# Altium footprint library ADP_SMT.PcbLib: 210 footprints (part 14 of 15)
Each footprint in its own frame and in the unit in brackets; x right, y up, seen from the top. Pads: shape width x height; smd on the part's side, far side on the other; paste and mask are expansions set on the pad; w line width, h text height; cw(c..) or ccw(c..) is an arc to the next point about the centre after c.
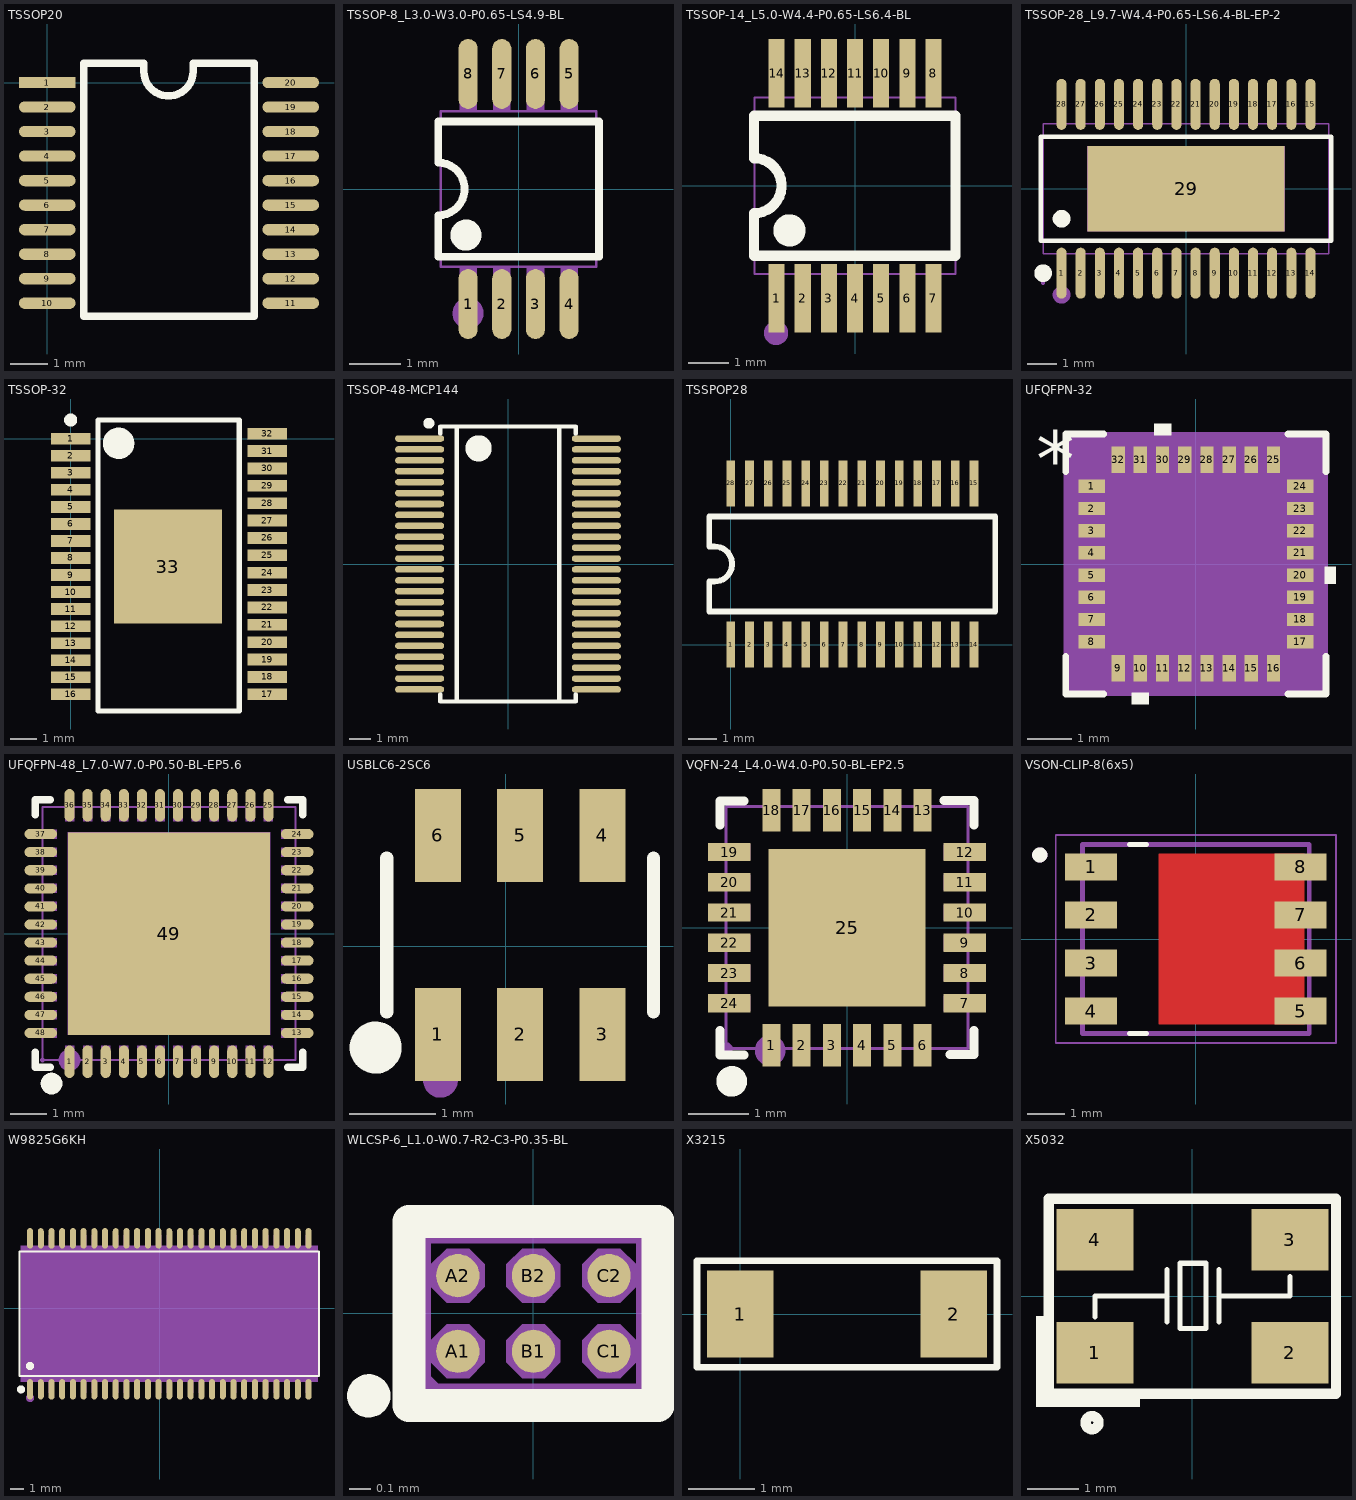
[diagram p13: the footprints below, top view; thin cyan lines are the x and y axes]

## TSSOP20 [mm]
pads (20):
  rect 1.5x0.3 smd: 1(0,0)
  oval 1.5x0.3 smd: 2(0,-0.65) 3(0,-1.3) 4(0,-1.95) 5(0,-2.6) 6(0,-3.25) 7(0,-3.9) 8(0,-4.55) 9(0,-5.2) 10(0,-5.85) 11(6.454,-5.85) 12(6.454,-5.2) 13(6.454,-4.55) 14(6.454,-3.9) 15(6.454,-3.25) 16(6.454,-2.6) 17(6.454,-1.95) 18(6.454,-1.3) 19(6.454,-0.65) 20(6.454,0)
Top Overlay:
  lines w0.2: 0.965,-6.2 0.965,0.508 2.559,0.508 2.559,0.3 ccw(c3.214,0.3) 3.87,0.3 3.87,0.508 5.486,0.508 5.486,-6.2 0.965,-6.2
3D body "TSSOP-20.STEP": height 1.2, standoff 0, extent -0.049,-6.221 6.501,0.379

## TSSOP-8_L3.0-W3.0-P0.65-LS4.9-BL [mm]
pads (8):
  oval 0.37x1.35 smd: 1(-0.975,-2.22) 2(-0.325,-2.22) 3(0.325,-2.22) 4(0.975,-2.22) 5(0.975,2.22) 6(0.325,2.22) 7(-0.325,2.22) 8(-0.975,2.22)
Top Overlay:
  circle w0.3: c-1.016,-0.889 r0.15
  lines w0.152: 1.552,1.298 1.552,-1.308 -1.552,-1.308 -1.552,-0.508 ccw(c-1.552,0) -1.552,0.508 -1.552,1.302 1.552,1.302
Mechanical 6:
  circle w0.3: c-0.975,-2.4 r0.15
Mechanical 15:
  region: 0.81,-2.45 0.81,-1.9 1.14,-1.9 1.14,-2.45
  region: 0.81,-1.91 0.81,-1.49 1.14,-1.49 1.14,-1.91
  region: 0.81,1.9 0.81,2.45 1.14,2.45 1.14,1.9
  region: 0.81,1.49 0.81,1.91 1.14,1.91 1.14,1.49
  region: -1.14,-2.45 -1.14,-1.9 -0.81,-1.9 -0.81,-2.45
  region: -1.14,-1.91 -1.14,-1.49 -0.81,-1.49 -0.81,-1.91
  region: -0.49,-2.45 -0.49,-1.9 -0.16,-1.9 -0.16,-2.45
  region: -0.49,-1.91 -0.49,-1.49 -0.16,-1.49 -0.16,-1.91
  region: 0.16,-2.45 0.16,-1.9 0.49,-1.9 0.49,-2.45
  region: 0.16,-1.91 0.16,-1.49 0.49,-1.49 0.49,-1.91
  region: -1.14,1.9 -1.14,2.45 -0.81,2.45 -0.81,1.9
  region: -1.14,1.49 -1.14,1.91 -0.81,1.91 -0.81,1.49
  region: -0.49,1.9 -0.49,2.45 -0.16,2.45 -0.16,1.9
  region: -0.49,1.49 -0.49,1.91 -0.16,1.91 -0.16,1.49
  region: 0.16,1.9 0.16,2.45 0.49,2.45 0.49,1.9
  region: 0.16,1.49 0.16,1.91 0.49,1.91 0.49,1.49
  region: -0.956,-0.889 -0.957,-0.865 -0.992,-0.83 -1.041,-0.83 -1.075,-0.865 -1.076,-0.889 -1.075,-0.914 -1.04,-0.948 -0.991,-0.948 -0.957,-0.913 -0.956,-0.889
  lines w0.051: -1.5,-1.5 1.5,-1.5 1.5,1.5 -1.5,1.5 -1.5,-1.5

## TSSOP-14_L5.0-W4.4-P0.65-LS6.4-BL [mm]
pads (14):
  rect 0.4x1.7 smd: 1(-1.95,-2.8) 2(-1.3,-2.8) 3(-0.65,-2.8) 4(0,-2.8) 5(0.65,-2.8) 6(1.3,-2.8) 7(1.95,-2.8) 8(1.95,2.8) 9(1.3,2.8) 10(0.65,2.8) 11(0,2.8) 12(-0.65,2.8) 13(-1.3,2.8) 14(-1.95,2.8)
Top Overlay:
  circle w0.4: c-1.63,-1.11 r0.2
  lines w0.254: -2.515,-1.74 2.5,-1.74 2.5,1.743 -2.515,1.743 -2.515,0.686 cw(c-2.515,0) -2.515,-0.686 -2.515,-1.74
Mechanical 6:
  circle w0.3: c-1.964,-3.662 r0.15
Mechanical 15:
  drawing of 33 lines, arcs and shapes, not listed

## TSSOP-28_L9.7-W4.4-P0.65-LS6.4-BL-EP-2 [mm]
pads (29):
  oval 0.343x1.731 smd: 1(-4.225,-2.866) 2(-3.575,-2.866) 3(-2.925,-2.866) 4(-2.275,-2.866) 5(-1.625,-2.866) 6(-0.975,-2.866) 7(-0.325,-2.866) 8(0.325,-2.866) 9(0.975,-2.866) 10(1.625,-2.866) 11(2.275,-2.866) 12(2.925,-2.866) 13(3.575,-2.866) 14(4.225,-2.866) 15(4.225,2.866) 16(3.575,2.866) 17(2.925,2.866) 18(2.275,2.866) 19(1.625,2.866) 20(0.975,2.866) 21(0.325,2.866) 22(-0.325,2.866) 23(-0.975,2.866) 24(-1.625,2.866) 25(-2.275,2.866) 26(-2.925,2.866) 27(-3.575,2.866) 28(-4.225,2.866)
  rect 6.7x2.9 smd paste+0 mask+0.05: 29(0,0)
Top Overlay:
  circle w0.3: c-4.225,-1.019 r0.15
  circle w0.3: c-4.849,-2.866 r0.15
  lines w0.152: -4.926,-1.771 4.926,-1.771 4.926,1.772 -4.926,1.772 -4.926,-1.771
Mechanical 6:
  circle w0.3: c-4.225,-3.6 r0.15
Mechanical 15:
  drawing of 62 lines, arcs and shapes, not listed

## TSSOP-32 [mm]
pads (33):
  rect 1.5x0.45 smd: 1(0,0) 2(0,-0.65) 3(0,-1.3) 4(0,-1.95) 5(0,-2.6) 6(0,-3.25) 7(0,-3.9) 8(0,-4.55) 9(0,-5.2) 10(0,-5.85) 11(0,-6.5) 12(0,-7.15) 13(0,-7.8) 14(0,-8.45) 15(0,-9.1) 16(0,-9.75) 17(7.5,-9.75) 18(7.5,-9.087) 19(7.5,-8.424) 20(7.5,-7.762) 21(7.5,-7.099) 22(7.5,-6.436) 23(7.5,-5.773) 24(7.5,-5.111) 25(7.5,-4.448) 26(7.5,-3.785) 27(7.5,-3.122) 28(7.5,-2.459) 29(7.5,-1.797) 30(7.5,-1.134) 31(7.5,-0.471) 32(7.5,0.192)
  rect 4.11x4.36 smd: 33(3.708,-4.877)
Top Overlay:
  circle w0.6: c1.829,-0.178 r0.3
  circle w0.25: c0,0.711 r0.125
  lines w0.2: 1.041,-10.389 1.041,0.711 6.426,0.711 6.426,-10.389 1.041,-10.389
3D body "User Library-TSSOP-32 11_1x6_2.STEP": height 1.1, standoff 0, extent -0.302,-10.351 7.798,0.749

## TSSOP-48-MCP144 [mm] "TSSOP, 48-Leads, Body 12.5x6.1mm, Pitch 0.5mm, IPC Medium Density"
height 1.2
pads (48):
  oval 2.25x0.3 smd: 1(-4.05,5.75) 2(-4.05,5.25) 3(-4.05,4.75) 4(-4.05,4.25) 5(-4.05,3.75) 6(-4.05,3.25) 7(-4.05,2.75) 8(-4.05,2.25) 9(-4.05,1.75) 10(-4.05,1.25) 11(-4.05,0.75) 12(-4.05,0.25) 13(-4.05,-0.25) 14(-4.05,-0.75) 15(-4.05,-1.25) 16(-4.05,-1.75) 17(-4.05,-2.25) 18(-4.05,-2.75) 19(-4.05,-3.25) 20(-4.05,-3.75) 21(-4.05,-4.25) 22(-4.05,-4.75) 23(-4.05,-5.25) 24(-4.05,-5.75) 25(4.05,-5.75) 26(4.05,-5.25) 27(4.05,-4.75) 28(4.05,-4.25) 29(4.05,-3.75) 30(4.05,-3.25) 31(4.05,-2.75) 32(4.05,-2.25) 33(4.05,-1.75) 34(4.05,-1.25) 35(4.05,-0.75) 36(4.05,-0.25) 37(4.05,0.25) 38(4.05,0.75) 39(4.05,1.25) 40(4.05,1.75) 41(4.05,2.25) 42(4.05,2.75) 43(4.05,3.25) 44(4.05,3.75) 45(4.05,4.25) 46(4.05,4.75) 47(4.05,5.25) 48(4.05,5.75)
Top Overlay:
  circle w0.25: c-3.625,6.45 r0.125
  circle w0.6: c-1.35,5.3 r0.3
  lines w0.2: -3.1,-5.969 -3.1,-6.3 3.1,-6.3 3.1,-5.969 ; -3.1,5.969 -3.1,6.3 3.1,6.3 3.1,5.969 ; -2.35,-6.3 -2.35,6.3 ; 2.35,-6.3 2.35,6.3
3D body "TSSOP-48-MCP144.STEP": height 1.2, standoff 0, extent -4.089,-6.299 4.099,6.301

## TSSPOP28 [mm]
pads (28):
  rect 0.3x1.6 smd: 1(0,0) 2(0.65,0) 3(1.299,0) 4(1.949,0) 5(2.599,0) 6(3.248,0) 7(3.898,0) 8(4.548,0) 9(5.197,0) 10(5.847,0) 11(6.497,0) 12(7.146,0) 13(7.796,0) 14(8.445,0) 15(8.445,5.6) 16(7.796,5.6) 17(7.146,5.6) 18(6.496,5.6) 19(5.847,5.6) 20(5.197,5.6) 21(4.548,5.6) 22(3.898,5.6) 23(3.248,5.6) 24(2.599,5.6) 25(1.949,5.6) 26(1.299,5.6) 27(0.65,5.6) 28(0,5.6)
Top Overlay:
  lines w0.2: -0.749,1.149 -0.749,2.191 -0.566,2.191 ccw(c-0.566,2.801) -0.566,3.41 -0.749,3.41 -0.749,4.451 9.182,4.451 9.182,1.149 -0.749,1.149
3D body "TSSOP28.STEP": height 1.05, standoff 0, extent -0.671,-0.601 9.129,5.999

## UFQFPN-32 [mm]
pads (32):
  rect 0.6x0.3 smd paste-0.15 mask+0: 1(-2.35,1.75) 2(-2.35,1.25) 3(-2.35,0.75) 4(-2.35,0.25) 5(-2.35,-0.25) 6(-2.35,-0.75) 7(-2.35,-1.25) 8(-2.35,-1.75) 17(2.35,-1.75) 18(2.35,-1.25) 19(2.35,-0.75) 20(2.35,-0.25) 21(2.35,0.25) 22(2.35,0.75) 23(2.35,1.25) 24(2.35,1.75)
  rect 0.3x0.6 smd paste-0.15 mask+0: 9(-1.75,-2.35) 10(-1.25,-2.35) 11(-0.75,-2.35) 12(-0.25,-2.35) 13(0.25,-2.35) 14(0.75,-2.35) 15(1.25,-2.35) 16(1.75,-2.35) 25(1.75,2.35) 26(1.25,2.35) 27(0.75,2.35) 28(0.25,2.35) 29(-0.25,2.35) 30(-0.75,2.35) 31(-1.25,2.35) 32(-1.75,2.35)
Top Overlay:
  region: -0.56,2.904 -0.941,2.904 -0.941,3.158 -0.56,3.158
  region: 2.904,-0.059 3.158,-0.059 3.158,-0.44 2.904,-0.44
  region: -1.06,-2.904 -1.441,-2.904 -1.441,-3.158 -1.06,-3.158
  lines w0.152: -2.931,-2.078 -2.931,-2.931 -2.078,-2.931 ; -2.931,2.078 -2.931,2.931 -2.078,2.931 ; 2.078,-2.931 2.931,-2.931 2.931,-2.078 ; 2.078,2.931 2.931,2.931 2.931,2.078
  text "*" at -3.602,1.746 h1.27
Top Paste:
  region: -1.6,2.65 -1.9,2.65 -1.9,2.05 -1.6,2.05
  region: -1.1,2.65 -1.4,2.65 -1.4,2.05 -1.1,2.05
  region: -0.6,2.65 -0.9,2.65 -0.9,2.05 -0.6,2.05
  region: -0.1,2.65 -0.4,2.65 -0.4,2.05 -0.1,2.05
  region: 0.4,2.65 0.1,2.65 0.1,2.05 0.4,2.05
  region: 0.9,2.65 0.6,2.65 0.6,2.05 0.9,2.05
  region: 1.4,2.65 1.1,2.65 1.1,2.05 1.4,2.05
  region: 1.9,2.65 1.6,2.65 1.6,2.05 1.9,2.05
  region: 2.65,1.9 2.05,1.9 2.05,1.6 2.65,1.6
  region: 2.65,1.4 2.05,1.4 2.05,1.1 2.65,1.1
  region: 2.65,0.9 2.05,0.9 2.05,0.6 2.65,0.6
  region: 2.65,0.4 2.05,0.4 2.05,0.1 2.65,0.1
  region: 2.65,-0.1 2.05,-0.1 2.05,-0.4 2.65,-0.4
  region: 2.65,-0.6 2.05,-0.6 2.05,-0.9 2.65,-0.9
  region: 2.65,-1.1 2.05,-1.1 2.05,-1.4 2.65,-1.4
  region: 2.65,-1.6 2.05,-1.6 2.05,-1.9 2.65,-1.9
  region: 1.9,-2.05 1.6,-2.05 1.6,-2.65 1.9,-2.65
  region: 1.4,-2.05 1.1,-2.05 1.1,-2.65 1.4,-2.65
  region: 0.9,-2.05 0.6,-2.05 0.6,-2.65 0.9,-2.65
  region: 0.4,-2.05 0.1,-2.05 0.1,-2.65 0.4,-2.65
  region: -0.1,-2.05 -0.4,-2.05 -0.4,-2.65 -0.1,-2.65
  region: -0.6,-2.05 -0.9,-2.05 -0.9,-2.65 -0.6,-2.65
  region: -1.1,-2.05 -1.4,-2.05 -1.4,-2.65 -1.1,-2.65
  region: -1.6,-2.05 -1.9,-2.05 -1.9,-2.65 -1.6,-2.65
  region: -2.05,-1.6 -2.65,-1.6 -2.65,-1.9 -2.05,-1.9
  region: -2.05,-1.1 -2.65,-1.1 -2.65,-1.4 -2.05,-1.4
  region: -2.05,-0.6 -2.65,-0.6 -2.65,-0.9 -2.05,-0.9
  region: -2.05,-0.1 -2.65,-0.1 -2.65,-0.4 -2.05,-0.4
  region: -2.05,0.4 -2.65,0.4 -2.65,0.1 -2.05,0.1
  region: -2.05,0.9 -2.65,0.9 -2.65,0.6 -2.05,0.6
  region: -2.05,1.4 -2.65,1.4 -2.65,1.1 -2.05,1.1
  region: -2.05,1.9 -2.65,1.9 -2.65,1.6 -2.05,1.6
Top Solder:
  region: -1.6,2.65 -1.9,2.65 -1.9,2.05 -1.6,2.05
  region: -1.1,2.65 -1.4,2.65 -1.4,2.05 -1.1,2.05
  region: -0.6,2.65 -0.9,2.65 -0.9,2.05 -0.6,2.05
  region: -0.1,2.65 -0.4,2.65 -0.4,2.05 -0.1,2.05
  region: 0.4,2.65 0.1,2.65 0.1,2.05 0.4,2.05
  region: 0.9,2.65 0.6,2.65 0.6,2.05 0.9,2.05
  region: 1.4,2.65 1.1,2.65 1.1,2.05 1.4,2.05
  region: 1.9,2.65 1.6,2.65 1.6,2.05 1.9,2.05
  region: 2.65,1.9 2.05,1.9 2.05,1.6 2.65,1.6
  region: 2.65,1.4 2.05,1.4 2.05,1.1 2.65,1.1
  region: 2.65,0.9 2.05,0.9 2.05,0.6 2.65,0.6
  region: 2.65,0.4 2.05,0.4 2.05,0.1 2.65,0.1
  region: 2.65,-0.1 2.05,-0.1 2.05,-0.4 2.65,-0.4
  region: 2.65,-0.6 2.05,-0.6 2.05,-0.9 2.65,-0.9
  region: 2.65,-1.1 2.05,-1.1 2.05,-1.4 2.65,-1.4
  region: 2.65,-1.6 2.05,-1.6 2.05,-1.9 2.65,-1.9
  region: 1.9,-2.05 1.6,-2.05 1.6,-2.65 1.9,-2.65
  region: 1.4,-2.05 1.1,-2.05 1.1,-2.65 1.4,-2.65
  region: 0.9,-2.05 0.6,-2.05 0.6,-2.65 0.9,-2.65
  region: 0.4,-2.05 0.1,-2.05 0.1,-2.65 0.4,-2.65
  region: -0.1,-2.05 -0.4,-2.05 -0.4,-2.65 -0.1,-2.65
  region: -0.6,-2.05 -0.9,-2.05 -0.9,-2.65 -0.6,-2.65
  region: -1.1,-2.05 -1.4,-2.05 -1.4,-2.65 -1.1,-2.65
  region: -1.6,-2.05 -1.9,-2.05 -1.9,-2.65 -1.6,-2.65
  region: -2.05,-1.6 -2.65,-1.6 -2.65,-1.9 -2.05,-1.9
  region: -2.05,-1.1 -2.65,-1.1 -2.65,-1.4 -2.05,-1.4
  region: -2.05,-0.6 -2.65,-0.6 -2.65,-0.9 -2.05,-0.9
  region: -2.05,-0.1 -2.65,-0.1 -2.65,-0.4 -2.05,-0.4
  region: -2.05,0.4 -2.65,0.4 -2.65,0.1 -2.05,0.1
  region: -2.05,0.9 -2.65,0.9 -2.65,0.6 -2.05,0.6
  region: -2.05,1.4 -2.65,1.4 -2.65,1.1 -2.05,1.1
  region: -2.05,1.9 -2.65,1.9 -2.65,1.6 -2.05,1.6
Mechanical 13:
  lines w0.025: -2.55,1.28 -1.28,2.55 ; -2.55,-2.55 -2.55,2.55 2.55,2.55 2.55,-2.55 -2.55,-2.55
  text "*" at -2.114,1.365 h1.27
Mechanical 15:
  region: -2.154,-2.804 -2.804,-2.804 -2.804,-2.154 -2.904,-2.154 -2.904,2.154 -2.804,2.154 -2.804,2.804 -2.154,2.804 -2.154,2.904 2.154,2.904 2.154,2.804 2.804,2.804 2.804,2.154 2.904,2.154 2.904,-2.154 2.804,-2.154 2.804,-2.804 2.154,-2.804 2.154,-2.904 -2.154,-2.904
  lines w0.152: -2.904,-2.154 -2.904,2.154 -2.804,2.154 -2.804,2.804 -2.154,2.804 -2.154,2.904 2.154,2.904 2.154,2.804 2.804,2.804 2.804,2.154 2.904,2.154 2.904,-2.154 2.804,-2.154 2.804,-2.804 2.154,-2.804 2.154,-2.904 -2.154,-2.904 -2.154,-2.804 -2.804,-2.804 -2.804,-2.154 -2.904,-2.154
3D body "UFQFPN-32.step": height 1.4, standoff 0, extent -2.601,-2.601 2.601,2.601

## UFQFPN-48_L7.0-W7.0-P0.50-BL-EP5.6 [mm]
pads (49):
  oval 0.28x0.9 smd paste-100 mask+0.051: 1(-2.751,-3.547) 2(-2.25,-3.547) 3(-1.75,-3.547) 4(-1.25,-3.547) 5(-0.749,-3.547) 6(-0.249,-3.547) 7(0.249,-3.547) 8(0.749,-3.547) 9(1.25,-3.547) 10(1.75,-3.547) 11(2.25,-3.547) 12(2.751,-3.547) 25(2.751,3.547) 26(2.25,3.547) 27(1.75,3.547) 28(1.25,3.547) 29(0.749,3.547) 30(0.249,3.547) 31(-0.249,3.547) 32(-0.749,3.547) 33(-1.25,3.547) 34(-1.75,3.547) 35(-2.25,3.547) 36(-2.751,3.547)
  oval 0.9x0.28 smd paste-100 mask+0.051: 13(3.547,-2.75) 14(3.547,-2.25) 15(3.547,-1.75) 16(3.547,-1.25) 17(3.547,-0.75) 18(3.547,-0.25) 19(3.547,0.25) 20(3.547,0.75) 21(3.547,1.25) 22(3.547,1.75) 23(3.547,2.25) 24(3.547,2.75) 37(-3.547,2.751) 38(-3.547,2.25) 39(-3.547,1.75) 40(-3.547,1.25) 41(-3.547,0.749) 42(-3.547,0.249) 43(-3.547,-0.249) 44(-3.547,-0.749) 45(-3.547,-1.25) 46(-3.547,-1.75) 47(-3.547,-2.25) 48(-3.547,-2.751)
  rect 5.6x5.6 smd paste-100 mask+0.051: 49(0,0)
Top Overlay:
  lines w0.2: -3.7,-3.275 -3.7,-3.7 -3.275,-3.7 ; -3.7,3.275 -3.7,3.7 -3.275,3.7 ; 3.275,-3.7 3.7,-3.7 3.7,-3.275 ; 3.275,3.7 3.7,3.7 3.7,3.275
  lines w0.3: -3.25,-4 ccw(c-3.249,-4.15) -3.249,-4.3 ccw(c-3.249,-4.15) -3.247,-4
Top Paste:
  drawing of 49 lines, arcs and shapes, not listed
Mechanical 6:
  circle w0.3: c-2.75,-3.5 r0.15
Mechanical 15:
  drawing of 54 lines, arcs and shapes, not listed

## USBLC6-2SC6 [mm]
pads (6):
  rect 0.532x1.072 smd: 1(-0.783,-1.02) 2(0.167,-1.02) 3(1.117,-1.02) 4(1.117,1.278) 5(0.167,1.278) 6(-0.783,1.278)
Top Overlay:
  circle w0.3: c-1.501,-1.172 r0.15
  lines w0.152: -1.372,-0.76 -1.372,1.018 ; 1.707,-0.76 1.707,1.018
Mechanical 15:
  circle w0.2: c-0.753,-1.551 r0.1

## VQFN-24_L4.0-W4.0-P0.50-BL-EP2.5 [mm]
pads (25):
  rect 0.3x0.7 smd paste-100 mask+0.051: 1(-1.25,-1.942) 2(-0.75,-1.942) 3(-0.25,-1.942) 4(0.25,-1.942) 5(0.75,-1.942) 6(1.25,-1.942) 13(1.25,1.942) 14(0.75,1.942) 15(0.25,1.942) 16(-0.25,1.942) 17(-0.75,1.942) 18(-1.25,1.942)
  rect 0.7x0.3 smd paste-100 mask+0.051: 7(1.948,-1.25) 8(1.948,-0.75) 9(1.948,-0.25) 10(1.948,0.25) 11(1.948,0.75) 12(1.948,1.25) 19(-1.948,1.25) 20(-1.948,0.75) 21(-1.948,0.25) 22(-1.948,-0.25) 23(-1.948,-0.75) 24(-1.948,-1.25)
  rect 2.6x2.6 smd paste-100 mask+0.051: 25(0.001,-0.001)
Top Overlay:
  circle w0.254: c-1.905,-2.54 r0.127
  lines w0.15: -2.1,-1.7 -2.1,-2.104 -1.7,-2.104 ; -2.1,1.696 -2.1,2.096 -1.7,2.096 ; 1.6,2.1 2.1,2.1 2.1,1.7 ; 1.7,-2.1 2.1,-2.1 2.1,-1.7
Top Paste:
  region: -1.1,-2.292 -1.4,-2.292 -1.4,-1.592 -1.1,-1.592
  region: -0.6,-2.292 -0.9,-2.292 -0.9,-1.592 -0.6,-1.592
  region: -0.1,-2.292 -0.4,-2.292 -0.4,-1.592 -0.1,-1.592
  region: 0.4,-2.292 0.1,-2.292 0.1,-1.592 0.4,-1.592
  region: 0.9,-2.292 0.6,-2.292 0.6,-1.592 0.9,-1.592
  region: 1.4,-2.292 1.1,-2.292 1.1,-1.592 1.4,-1.592
  region: 2.298,-1.1 2.298,-1.4 1.598,-1.4 1.598,-1.1
  region: 2.298,-0.6 2.298,-0.9 1.598,-0.9 1.598,-0.6
  region: 2.298,-0.1 2.298,-0.4 1.598,-0.4 1.598,-0.1
  region: 2.298,0.4 2.298,0.1 1.598,0.1 1.598,0.4
  region: 2.298,0.9 2.298,0.6 1.598,0.6 1.598,0.9
  region: 2.298,1.4 2.298,1.1 1.598,1.1 1.598,1.4
  region: 1.1,2.292 1.4,2.292 1.4,1.592 1.1,1.592
  region: 0.6,2.292 0.9,2.292 0.9,1.592 0.6,1.592
  region: 0.1,2.292 0.4,2.292 0.4,1.592 0.1,1.592
  region: -0.4,2.292 -0.1,2.292 -0.1,1.592 -0.4,1.592
  region: -0.9,2.292 -0.6,2.292 -0.6,1.592 -0.9,1.592
  region: -1.4,2.292 -1.1,2.292 -1.1,1.592 -1.4,1.592
  region: -2.298,1.1 -2.298,1.4 -1.598,1.4 -1.598,1.1
  region: -2.298,0.6 -2.298,0.9 -1.598,0.9 -1.598,0.6
  region: -2.298,0.1 -2.298,0.4 -1.598,0.4 -1.598,0.1
  region: -2.298,-0.4 -2.298,-0.1 -1.598,-0.1 -1.598,-0.4
  region: -2.298,-0.9 -2.298,-0.6 -1.598,-0.6 -1.598,-0.9
  region: -2.298,-1.4 -2.298,-1.1 -1.598,-1.1 -1.598,-1.4
  region: -1.039,-1.041 -1.039,1.039 1.041,1.039 1.041,-1.041
Mechanical 6:
  circle w0.254: c-1.27,-2.032 r0.127
Mechanical 15:
  region: -1.997,-1.125 -1.597,-1.125 -1.597,-1.375 -1.997,-1.375
  region: -1.997,-0.625 -1.597,-0.625 -1.597,-0.875 -1.997,-0.875
  region: -1.997,-0.125 -1.597,-0.125 -1.597,-0.375 -1.997,-0.375
  region: -1.997,0.375 -1.597,0.375 -1.597,0.125 -1.997,0.125
  region: -1.997,0.875 -1.597,0.875 -1.597,0.625 -1.997,0.625
  region: -1.997,1.375 -1.597,1.375 -1.597,1.125 -1.997,1.125
  region: 2,1.122 1.6,1.122 1.6,1.372 2,1.372
  region: 2,0.622 1.6,0.622 1.6,0.872 2,0.872
  region: 2,0.122 1.6,0.122 1.6,0.372 2,0.372
  region: 2,-0.378 1.6,-0.378 1.6,-0.128 2,-0.128
  region: 2,-0.878 1.6,-0.878 1.6,-0.628 2,-0.628
  region: 2,-1.378 1.6,-1.378 1.6,-1.128 2,-1.128
  region: -1.123,1.998 -1.123,1.598 -1.373,1.598 -1.373,1.998
  region: -0.624,1.998 -0.624,1.598 -0.874,1.598 -0.874,1.998
  region: -0.123,1.998 -0.123,1.598 -0.373,1.598 -0.373,1.998
  region: 0.376,1.998 0.376,1.598 0.126,1.598 0.126,1.998
  region: 0.877,1.998 0.877,1.598 0.627,1.598 0.627,1.998
  region: 1.376,1.998 1.376,1.598 1.126,1.598 1.126,1.998
  region: 1.125,-2 1.125,-1.6 1.375,-1.6 1.375,-2
  region: 0.625,-2 0.625,-1.6 0.875,-1.6 0.875,-2
  region: 0.125,-2 0.125,-1.6 0.375,-1.6 0.375,-2
  region: -0.375,-2 -0.375,-1.6 -0.125,-1.6 -0.125,-2
  region: -0.875,-2 -0.875,-1.6 -0.625,-1.6 -0.625,-2
  region: -1.375,-2 -1.375,-1.6 -1.125,-1.6 -1.125,-2
  region: -1.249,1.249 1.251,1.249 1.251,-1.251 -1.249,-1.251
  region: -1.9,-2 -1.9,-1.959 -1.959,-1.9 -2.041,-1.9 -2.1,-1.959 -2.1,-2 -2.1,-2.042 -2.041,-2.1 -1.959,-2.1 -1.9,-2.042 -1.9,-2
  lines w0.051: -2,-2 -2,2 2,2 2,-2 -2,-2

## VSON-CLIP-8(6x5) [mm]
height 1.05
pads (8):
  rect 1.372x0.71 smd paste-2: 1(-2.77,1.905) 2(-2.77,0.635) 3(-2.77,-0.635) 4(-2.77,-1.905)
  rect 1.372x0.71 smd paste-2 mask+0: 5(2.77,-1.905) 6(2.77,-0.635) 7(2.77,0.635) 8(2.77,1.905)
Top Layer:
  region: 2.866,-2.26 -0.984,-2.26 -0.984,2.26 2.866,2.26
Top Overlay:
  circle w0.2: c-4.127,2.222 r0.1
  lines w0.127: -1.764,-2.5 -1.304,-2.5 ; -1.764,2.5 -1.304,2.5
Top Paste:
  region: 0.597,1.196 -0.697,1.196 -0.697,1.942 0.597,1.942
  region: 0.597,0.15 -0.697,0.15 -0.697,0.896 0.597,0.896
  region: 0.597,-0.896 -0.697,-0.896 -0.697,-0.15 0.597,-0.15
  region: 0.597,-1.942 -0.697,-1.942 -0.697,-1.196 0.597,-1.196
  region: 2.241,-1.942 0.947,-1.942 0.947,-1.196 2.241,-1.196
  region: 2.241,1.196 0.947,1.196 0.947,1.942 2.241,1.942
  region: 2.241,-0.896 0.947,-0.896 0.947,-0.15 2.241,-0.15
  region: 2.241,0.15 0.947,0.15 0.947,0.896 2.241,0.896
  region: 3.293,-2.159 2.527,-2.159 2.527,-1.651 3.293,-1.651
  region: 3.293,-0.889 2.527,-0.889 2.527,-0.381 3.293,-0.381
  region: 3.293,0.381 2.527,0.381 2.527,0.889 3.293,0.889
  region: 3.293,1.651 2.527,1.651 2.527,2.159 3.293,2.159
  region: -2.221,-2.186 -3.293,-2.186 -3.293,-1.624 -2.221,-1.624
  region: -2.221,-0.916 -3.293,-0.916 -3.293,-0.354 -2.221,-0.354
  region: -2.221,0.354 -3.293,0.354 -3.293,0.916 -2.221,0.916
  region: -2.221,1.624 -3.293,1.624 -3.293,2.186 -2.221,2.186
Top Solder:
  region: 3.556,1.45 2.966,1.45 2.966,1.09 3.556,1.09 3.556,0.18 2.966,0.18 2.966,-0.18 3.556,-0.18 3.556,-1.09 2.966,-1.09 2.966,-1.45 3.566,-1.45 3.566,-2.36 -1.084,-2.36 -1.084,2.36 3.556,2.36
Mechanical 13:
  circle w0.2: c-4.127,2.222 r0.1
  lines w0.127: -3,-2.5 3,-2.5 3,2.5 -3,2.5 -3,-2.5
Mechanical 15:
  lines w0.05: -3.706,-2.75 -3.706,2.75 3.706,2.75 3.706,-2.75 -3.706,-2.75
3D body "step_temp.STEP": height 1.05, standoff 0, extent -3,-2.5 3,2.5

## W9825G6KH [mil]
pads (54):
  oval 17.64x60 smd: 1(-381.05,-238.98) 2(-349.55,-238.98) 3(-318.06,-238.98) 4(-286.56,-238.98) 5(-255.06,-238.98) 6(-223.57,-238.98) 7(-192.07,-238.98) 8(-160.57,-238.98) 9(-129.08,-238.98) 10(-97.58,-238.98) 11(-66.09,-238.98) 12(-34.59,-238.98) 13(-3.09,-238.98) 14(28.4,-238.98) 15(59.9,-238.98) 16(91.39,-238.98) 17(122.89,-238.98) 18(154.39,-238.98) 19(185.88,-238.98) 20(217.38,-238.98) 21(248.87,-238.98) 22(280.37,-238.98) 23(311.87,-238.98) 24(343.36,-238.98) 25(374.86,-238.98) 26(406.36,-238.98) 27(437.85,-238.98) 28(437.85,205.28) 29(406.36,205.28) 30(374.86,205.28) 31(343.36,205.28) 32(311.87,205.28) 33(280.37,205.28) 34(248.87,205.28) 35(217.38,205.28) 36(185.88,205.28) 37(154.39,205.28) 38(122.89,205.28) 39(91.39,205.28) 40(59.9,205.28) 41(28.4,205.28) 42(-3.09,205.28) 43(-34.59,205.28) 44(-66.09,205.28) 45(-97.58,205.28) 46(-129.08,205.28) 47(-160.57,205.28) 48(-192.07,205.28) 49(-223.57,205.28) 50(-255.06,205.28) 51(-286.56,205.28) 52(-318.06,205.28) 53(-349.55,205.28) 54(-381.05,205.28)
Top Overlay:
  circle w11.81: c-407.68,-238.98 r5.91
  circle w11.81: c-381.05,-170.35 r5.91
  lines w6: -412,-199.98 468.8,-199.98 468.8,166.28 -412,166.28 -412,-199.98
Mechanical 4:
  region: -409,-216.85 -409,183.15 465.8,183.15 465.8,-216.85
Mechanical 5:
  drawing of 108 lines, arcs and shapes, not listed
Mechanical 6:
  circle w2.36: c-409,-248.35 r1.18
Mechanical 15:
  circle w11.81: c-381.05,-264.09 r5.91

## WLCSP-6_L1.0-W0.7-R2-C3-P0.35-BL [mm]
pads (6):
  round 0.2 smd paste-100 mask+0.051: A1(-0.35,-0.175) A2(-0.35,0.175) B1(0,-0.175) B2(0,0.175) C1(0.35,-0.175) C2(0.35,0.175)
Top Overlay:
  circle w0.1: c-0.762,-0.381 r0.05
  lines w0.152: -0.576,-0.426 0.576,-0.426 0.576,0.426 -0.576,0.426 -0.576,-0.426
Top Paste:
  region: -0.43,-0.075 -0.27,-0.075 -0.25,-0.095 -0.25,-0.255 -0.27,-0.275 -0.43,-0.275 -0.45,-0.255 -0.45,-0.095
  region: -0.43,0.275 -0.27,0.275 -0.25,0.255 -0.25,0.095 -0.27,0.075 -0.43,0.075 -0.45,0.095 -0.45,0.255
  region: -0.08,-0.075 0.08,-0.075 0.1,-0.095 0.1,-0.255 0.08,-0.275 -0.08,-0.275 -0.1,-0.255 -0.1,-0.095
  region: -0.08,0.275 0.08,0.275 0.1,0.255 0.1,0.095 0.08,0.075 -0.08,0.075 -0.1,0.095 -0.1,0.255
  region: 0.27,-0.075 0.43,-0.075 0.45,-0.095 0.45,-0.255 0.43,-0.275 0.27,-0.275 0.25,-0.255 0.25,-0.095
  region: 0.27,0.275 0.43,0.275 0.45,0.255 0.45,0.095 0.43,0.075 0.27,0.075 0.25,0.095 0.25,0.255
Mechanical 15:
  region: -0.44,-0.35 -0.44,-0.325 -0.475,-0.29 -0.525,-0.29 -0.56,-0.325 -0.56,-0.35 -0.56,-0.375 -0.525,-0.41 -0.475,-0.41 -0.44,-0.375 -0.44,-0.35
  region: -0.225,-0.175 -0.225,-0.123 -0.298,-0.05 -0.402,-0.05 -0.475,-0.123 -0.475,-0.175 -0.475,-0.227 -0.402,-0.3 -0.298,-0.3 -0.225,-0.227 -0.225,-0.175
  region: -0.225,0.175 -0.225,0.227 -0.298,0.3 -0.402,0.3 -0.475,0.227 -0.475,0.175 -0.475,0.123 -0.402,0.05 -0.298,0.05 -0.225,0.123 -0.225,0.175
  region: 0.125,-0.175 0.125,-0.123 0.052,-0.05 -0.052,-0.05 -0.125,-0.123 -0.125,-0.175 -0.125,-0.227 -0.052,-0.3 0.052,-0.3 0.125,-0.227 0.125,-0.175
  region: 0.125,0.175 0.125,0.227 0.052,0.3 -0.052,0.3 -0.125,0.227 -0.125,0.175 -0.125,0.123 -0.052,0.05 0.052,0.05 0.125,0.123 0.125,0.175
  region: 0.475,-0.175 0.475,-0.123 0.402,-0.05 0.298,-0.05 0.225,-0.123 0.225,-0.175 0.225,-0.227 0.298,-0.3 0.402,-0.3 0.475,-0.227 0.475,-0.175
  region: 0.475,0.175 0.475,0.227 0.402,0.3 0.298,0.3 0.225,0.227 0.225,0.175 0.225,0.123 0.298,0.05 0.402,0.05 0.475,0.123 0.475,0.175
  lines w0.051: -0.5,-0.35 0.5,-0.35 0.5,0.35 -0.5,0.35 -0.5,-0.35

## X3215 [mm]
pads (2):
  rect 1x1.3 smd: 1(0,0) 2(3.2,0)
Top Overlay:
  lines w0.1: -0.65,-0.8 -0.65,0.8 3.85,0.8 3.85,-0.8 -0.65,-0.8
3D body "User Library-X3215.STEP": height 0.81, standoff 0, extent 0,-0.762 3.2,0.738

## X5032 [mm]
pads (4):
  rect 1.5x1.2 smd: 1(-1.9,-1.1) 2(1.9,-1.1) 3(1.9,1.1) 4(-1.9,1.1)
Top Overlay:
  circle w0.2: c-1.956,-2.464 r0.127
  rectangle: -3.048,-2.159 -2.87,-0.381
  rectangle: -3.023,-2.159 -1.016,-1.905
  lines w0.1: -1.897,-0.406 -1.897,0.008 -0.496,0.008 ; -0.496,-0.5 -0.496,0.516 ; 0.52,-0.5 0.52,0.516 ; 0.52,0.008 1.902,0.008 1.905,0.016 1.905,0.381 ; -0.242,-0.627 0.266,-0.627 0.266,-0.309 0.266,0.326 0.266,0.643 -0.242,0.643 -0.242,-0.627
  lines w0.2: -2.8,-1.9 -2.8,1.9 2.8,1.9 2.8,-1.9 -2.8,-1.9
3D body "User Library-CRYSTALSMD5X32.STEP": height 1, standoff 0, extent -2.5,-1.6 2.5,1.6